# Altium footprint library Footprints.PcbLib: 158 footprints (part 5 of 10)
Each footprint in its own frame and in the unit in brackets; x right, y up, seen from the top. Pads: shape width x height; smd on the part's side, far side on the other; paste and mask are expansions set on the pad; w line width, h text height; cw(c..) or ccw(c..) is an arc to the next point about the centre after c.
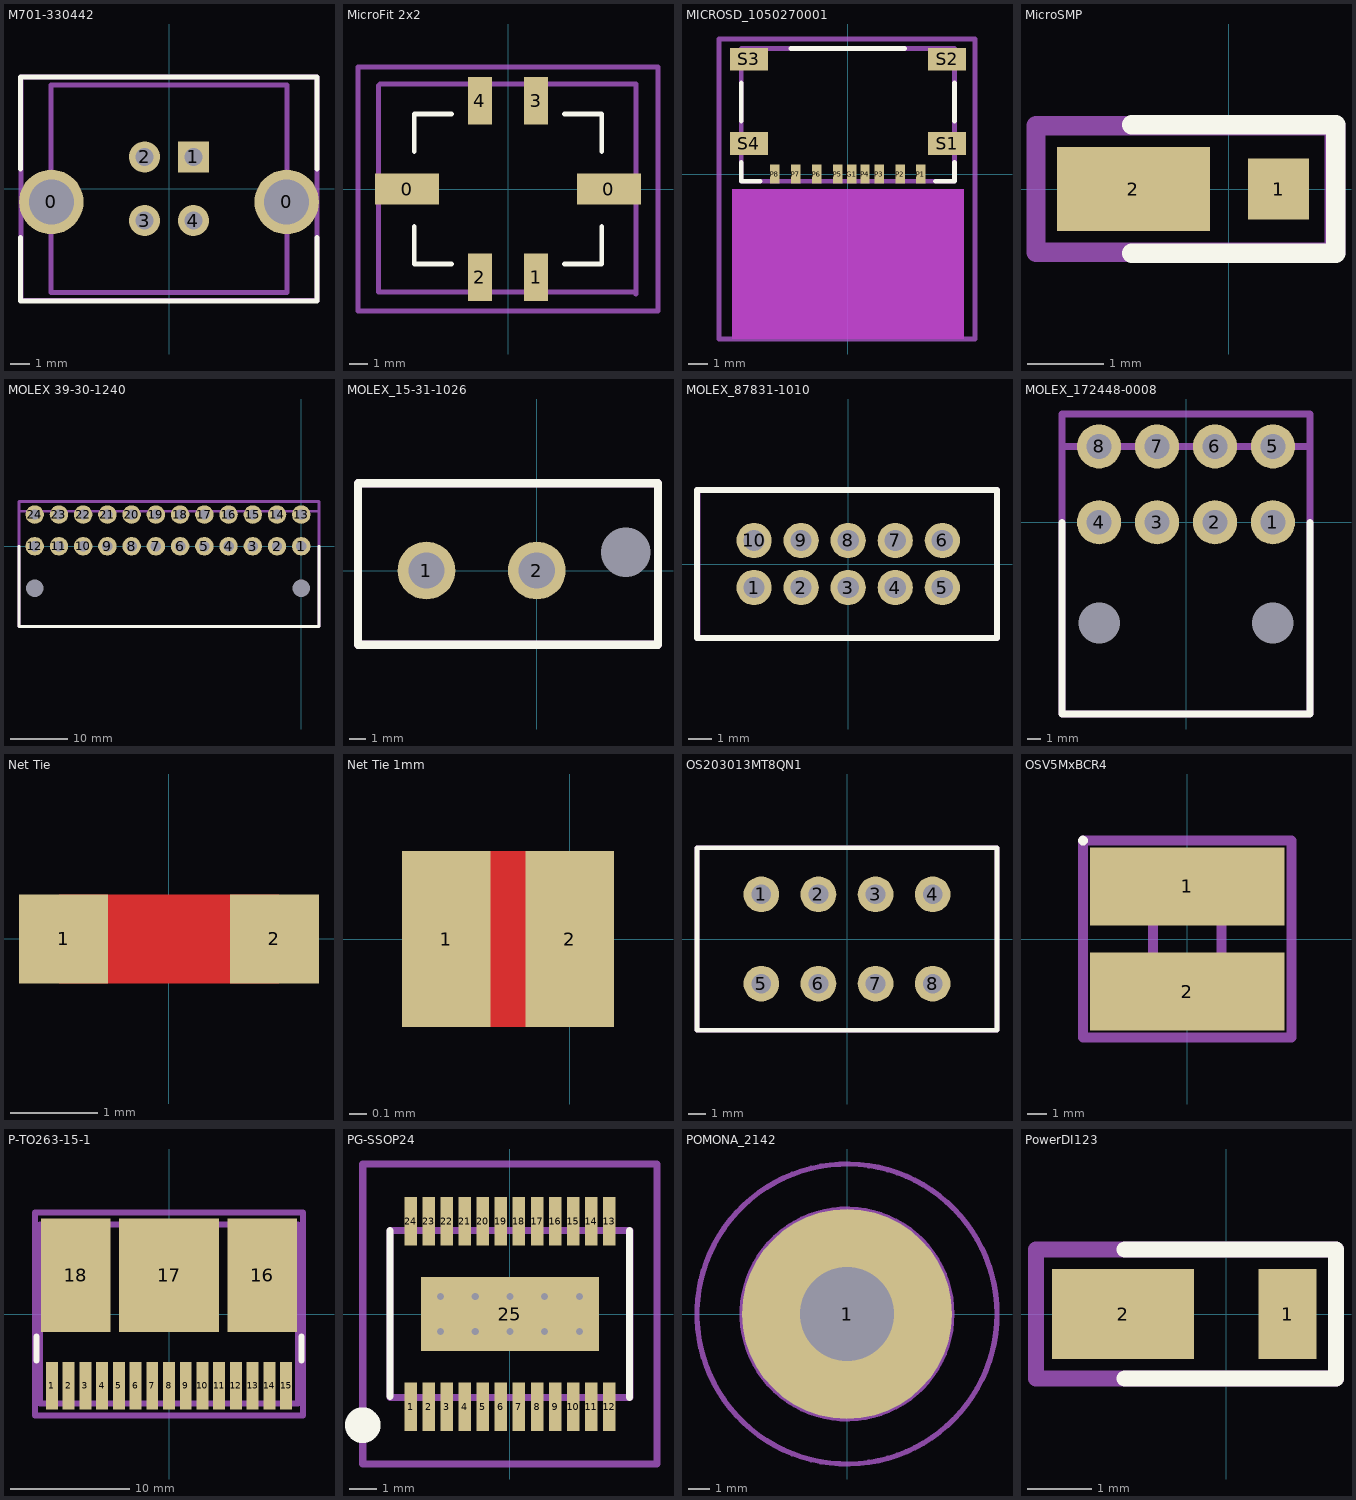
[diagram p4: the footprints below, top view; thin cyan lines are the x and y axes]

## M701-330442 [mm] "Vertical Boardmount USB Connector"
height 16.25
pads (6):
  round 3.3 hole 2.3 mask+0.102: 0(-6.02,-0.675) 0(6.02,-0.675)
  rect 1.6x1.6 hole 0.92 mask+0.102: 1(1.25,1.625)
  round 1.6 hole 0.92 mask+0.102: 2(-1.25,1.625) 3(-1.25,-1.625) 4(1.25,-1.625)
Top Overlay:
  lines w0.254: -7.6,-2.5 -7.6,-5.75 7.575,-5.75 7.575,-2.5 ; -7.6,1 -7.6,5.725 7.575,5.725 7.575,1
Mechanical 13:
  lines w0.254: -6.025,-5.3 6.025,-5.3 6.025,5.3 -6.025,5.3 -6.025,-5.3
Mechanical 15:
  lines w0.254: -7.575,-5.725 7.575,-5.725 7.575,5.725 -7.575,5.725 -7.575,-5.725
3D body: height 15.82, standoff -3.82, extent -7.575,-5.728 7.575,5.728

## MicroFit 2x2 [mm]
height 9.9
pads (6):
  rect 3.43x1.65 smd: 0(-5.385,0) 0(5.385,0)
  rect 1.27x2.54 smd: 1(1.5,-4.7) 2(-1.5,-4.7) 3(1.5,4.7) 4(-1.5,4.7)
Top Overlay:
  lines w0.254: -5,-2 -5,-4 -3,-4 ; -5,2 -5,4 -3,4 ; 3,-4 5,-4 5,-2 ; 3,4 5,4 5,2
Mechanical 13:
  lines w0.254: -6.9,-5.5 6.725,-5.5 6.825,-5.6 6.825,5.6 -6.825,5.6 -6.9,5.525 -6.9,-5.5
Mechanical 15:
  lines w0.254: -7.9,-6.5 -8,-6.5 ; -8,-6.5 8,-6.5 8,6.5 -8,6.5 -8,-6.5
3D body: height 9.95, standoff -0.01, extent -6.825,-5.6 6.825,5.6

## MICROSD_1050270001 [mm]
height 1.7
pads (13):
  rect 0.5x1 smd: G1(0.2,0) P1(3.85,0) P2(2.75,0) P3(1.65,0) P4(0.9,0) P5(-0.55,0) P6(-1.65,0) P7(-2.75,0) P8(-3.85,0)
  rect 2x1.2 smd: S1(5.225,1.61) S2(5.225,6.06) S3(-5.225,6.06) S4(-5.225,1.61)
Top Overlay:
  lines w0.254: -5.625,0.625 -5.625,-0.375 -4.625,-0.375 ; -5.625,2.8 -5.625,4.8 ; -3,6.625 3,6.625 ; 4.625,-0.375 5.625,-0.375 5.625,0.625 ; 5.625,2.8 5.625,4.8
Mechanical 13:
  lines w0.254: -5.625,-0.375 -5.625,6.625 5.625,6.625 5.625,-0.375 -5.625,-0.375
Mechanical 15:
  lines w0.254: -6.8,-8.7 6.7,-8.7 6.7,7.125 -6.8,7.125 -6.8,-8.7
Mechanical 15 keep-out:
  rectangle: -6.125,-8.7 6.125,-0.787
3D body: height 1.7, standoff 0, extent -5.62,-0.37 5.62,6.63

## MicroSMP [mm]
height 0.73
pads (2):
  rect 0.8x0.8 smd mask+0.102: 1(0.65,0)
  rect 2x1.1 smd mask+0.102: 2(-1.25,0)
Top Overlay:
  lines w0.254: -1.27,-0.838 1.397,-0.838 1.397,0.838 -1.27,0.838
Mechanical 13:
  lines w0.254: -2.525,-0.825 -2.525,0.825 1.375,0.825 1.375,-0.825 -2.525,-0.825
Mechanical 15:
  lines w0.254: -2.525,-0.825 1.4,-0.825 1.4,0.825 -2.525,0.825 -2.525,-0.825
3D body: height 1.35, standoff 0, extent -2.5,-1.101 1.35,1.052

## MOLEX 39-30-1240 [mm] "Connector for ATX power supply"
height 9.6
pads (26):
  round 0 hole 3 mask+0.102: 0(-46.2,-7.3) 0(0,-7.3)
  round 3.2 hole 1.8 mask+0.102: 1(0,0) 2(-4.2,0) 3(-8.4,0) 4(-12.6,0) 5(-16.8,0) 6(-21,0) 7(-25.2,0) 8(-29.4,0) 9(-33.6,0) 10(-37.8,0) 11(-42,0) 12(-46.2,0) 13(0,5.5) 14(-4.2,5.5) 15(-8.4,5.5) 16(-12.6,5.5) 17(-16.8,5.5) 18(-21,5.5) 19(-25.2,5.5) 20(-29.4,5.5) 21(-33.6,5.5) 22(-37.8,5.5) 23(-42,5.5) 24(-46.2,5.5)
Top Overlay:
  lines w0.508: -48.92,0 -48.92,-13.868 3.073,-13.868 3.073,0
Mechanical 13:
  lines w0.508: -48.895,-13.868 3.073,-13.868 3.073,6.071 -48.895,6.071 -48.895,-13.843
Mechanical 15:
  lines w0.508: -48.92,-13.868 -48.92,7.722 3.073,7.722 3.073,-13.868 -48.92,-13.868
3D body: height 11.4, standoff -3.6, extent -48.901,-13.854 3.099,6.081

## MOLEX_15-31-1026 [mm]
height 15
pads (3):
  round 0 hole 3 mask+0.102: 0(5.4,1.1)
  round 3.5 hole 2.2 mask+0.102: 1(-6.7,0) 2(0,0)
Top Overlay:
  lines w0.508: -10.85,-4.5 -10.85,5.3 7.35,5.3 7.35,-4.5 -10.85,-4.5
Mechanical 1:
  lines w0.508: 7.35,5.3 7.35,5.3 ; 7.35,5.3 7.35,5.3 ; 7.35,-4.5 7.35,-4.5
Mechanical 13:
  lines w0.508: -10.85,-4.5 -10.85,5.3 7.35,5.3 7.35,-4.5 -10.85,-4.5
Mechanical 15:
  lines w0.508: -10.85,-4.5 7.35,-4.5 7.35,5.3 -10.85,5.3 -10.85,-4.5
3D body: height 15, standoff -3.8, extent -10.85,-4.5 7.35,5.3

## MOLEX_87831-1010 [mm] "Boardmount Receptacle for 2x5 IDC Header"
height 6.4
pads (10):
  round 1.5 hole 0.9: 1(-4,-1) 2(-2,-1) 3(0,-1) 4(2,-1) 5(4,-1) 6(4,1) 7(2,1) 8(0,1) 9(-2,1) 10(-4,1)
Top Overlay:
  lines w0.254: -6.426,-3.15 6.325,-3.15 6.325,3.15 -6.426,3.15 -6.426,-3.15
Mechanical 13:
  lines w0.254: -6.401,-3.15 6.325,-3.15 6.325,3.15 -6.401,3.15 -6.401,-3.15
3D body: height 6.5, standoff -3.4, extent -6.35,-3.175 6.3,3.125

## MOLEX_172448-0008 [mm]
height 9.6
pads (10):
  round 0 hole 3 mask+0.102: 0(-6.3,-7.3) 0(6.3,-7.3)
  round 3.2 hole 1.8 mask+0.102: 1(6.3,0) 2(2.1,0) 3(-2.1,0) 4(-6.3,0) 5(6.3,5.5) 6(2.1,5.5) 7(-2.1,5.5) 8(-6.3,5.5)
Top Overlay:
  lines w0.508: -9,0 -9,-13.9 9,-13.9 9,0
Mechanical 13:
  lines w0.508: -9,-13.9 9,-13.9 9,5.5 -9,5.5 -9,0 -9,-13.9
Mechanical 15:
  lines w0.508: -9,-13.9 9,-13.9 9,7.85 -9,7.85 -9,-13.9
3D body: height 9.6, standoff 0, extent -9,-13.9 9,0

## Net Tie [mm]
pads (2):
  rect 1.02x1.02 smd mask+0.102: 1(-1.205,0) 2(1.205,0)
Top Layer:
  lines w1.02: -1.205,0 1.205,0
Top Solder:
  rectangle: -0.65,-0.6 0.7,0.6
3D body: height 1.99, standoff -0.01, extent -1.451,-0.5 1.451,0.5

## Net Tie 1mm [mm]
pads (2):
  rect 0.5x1 smd: 1(-0.7,0) 2(0,0)
Top Layer:
  lines w0.5: -0.7,0.25 0,0.25 ; -0.675,-0.25 0,-0.25

## OS203013MT8QN1 [mm] "DP3T Slide Switch"
height 2.88
pads (8):
  round 2 hole 1.1 mask+0.102: 1(-4.8,2.5) 2(-1.6,2.5) 3(1.6,2.5) 4(4.8,2.5) 5(-4.8,-2.5) 6(-1.6,-2.5) 7(1.6,-2.5) 8(4.8,-2.5)
Top Overlay:
  lines w0.254: -8.4,-5.1 8.4,-5.1 8.4,5.1 -8.4,5.1 -8.4,-5.1
Mechanical 13:
  lines w0.254: -8.4,-5.1 8.4,-5.1 8.4,5.1 -8.4,5.1 -8.4,-5.1
Mechanical 15:
  lines w0.254: -8.4,-5.1 8.4,-5.1 8.4,5.1 -8.4,5.1 -8.4,-5.1
3D body: height 10, standoff 0, extent -5.1,-1.8 -2,1.8
3D body: height 7, standoff 0, extent -8.4,-5.1 8.4,5.1
3D body: height 7.1, standoff 1, extent -5.1,-1.8 5.1,1.8

## OSV5MxBCR4 [mm] "High Power Red LED"
height 1.2
pads (2):
  rect 10x4 smd mask+0.102: 1(0,2.7) 2(0,-2.7)
Top Overlay:
  circle w0.254: c-5.35,5.05 r0.125
Mechanical 13:
  lines w0.508: -1.75,-1.75 -1.75,1.75 1.75,1.75 1.75,-1.75 -1.75,-1.75
Mechanical 15:
  lines w0.508: -5.35,-5.05 -5.35,5.05 5.35,5.05 5.35,-5.05 -5.35,-5.05
3D body: height 1.6, standoff -0.05, extent -1.4,-1.775 1.4,1.725

## P-TO263-15-1 [mm]
height 4.4
pads (18):
  rect 1x4 smd mask+0.102: 1(-9.8,-6) 2(-8.4,-6) 3(-7,-6) 4(-5.6,-6) 5(-4.2,-6) 6(-2.8,-6) 7(-1.4,-6) 8(0,-6) 9(1.4,-6) 10(2.8,-6) 11(4.2,-6) 12(5.6,-6) 13(7,-6) 14(8.4,-6) 15(9.8,-6)
  rect 5.8x9.5 smd mask+0.102: 16(7.8,3.25) 18(-7.8,3.25)
  rect 8.4x9.5 smd mask+0.102: 17(0,3.25)
Top Overlay:
  lines w0.508: -11.1,-3.9 -11.1,-1.9 ; 11.1,-3.9 11.1,-1.9
Mechanical 13:
  lines w0.508: -10.8,-7.5 -10.8,7.5 10.8,7.5 10.8,-7.5 -10.6,-7.5 -10.8,-7.5
Mechanical 15:
  lines w0.508: -11.2,-8.5 11.2,-8.5 11.2,8.5 -11.2,8.5 -11.2,-8.5
3D body: height 4.45, standoff 0, extent -10.8,-7.4 10.8,7.6

## PG-SSOP24 [mm]
height 1.7
pads (25):
  rect 0.45x1.75 smd: 1(-3.575,-3.345) 2(-2.925,-3.345) 3(-2.275,-3.345) 4(-1.625,-3.345) 5(-0.975,-3.345) 6(-0.325,-3.345) 7(0.325,-3.345) 8(0.975,-3.345) 9(1.625,-3.345) 10(2.275,-3.345) 11(2.925,-3.345) 12(3.575,-3.345) 13(3.575,3.345) 14(2.925,3.345) 15(2.275,3.345) 16(1.625,3.345) 17(0.975,3.345) 18(0.325,3.345) 19(-0.325,3.345) 20(-0.975,3.345) 21(-1.625,3.345) 22(-2.275,3.345) 23(-2.925,3.345) 24(-3.575,3.345)
  rect 6.4x2.65 smd: 25(0,0)
via -2.5,-0.625 diameter 0.635 hole 0.254
via -1.25,-0.625 diameter 0.635 hole 0.254
via 0,-0.625 diameter 0.635 hole 0.254
via 1.25,-0.625 diameter 0.635 hole 0.254
via 2.5,-0.625 diameter 0.635 hole 0.254
via 2.5,0.625 diameter 0.635 hole 0.254
via 1.25,0.625 diameter 0.635 hole 0.254
via 0,0.625 diameter 0.635 hole 0.254
via -1.25,0.625 diameter 0.635 hole 0.254
via -2.5,0.625 diameter 0.635 hole 0.254
Bottom Layer:
  region: -3.2,1.325 3.2,1.325 3.2,-1.325 -3.2,-1.325
Top Overlay:
  circle w1: c-5.3,-4 r0.141
  lines w0.254: -4.325,-2.975 -4.325,3 ; 4.3,-3 4.3,3
Bottom Solder:
  region: -3.3,1.425 3.3,1.425 3.3,-1.425 -3.3,-1.425
Mechanical 13:
  lines w0.254: -4.325,-3 -4.325,3 4.325,3 4.325,-3 -4.325,-3
Mechanical 15:
  lines w0.254: -5.3,-5.4 5.3,-5.4 5.3,5.4 -5.3,5.4 -5.3,-5.4
3D body: height 1.21, standoff -0.01, extent -3.9,-3.201 3.899,3.201

## POMONA_2142 [mm] "Single"
height 22.35
pads (1):
  round 10 hole 4.5 mask+0.102: 1(0,0)
Mechanical 13:
  circle w0.254: c0,0 r5
Mechanical 15:
  circle w0.254: c0,0 r7.15
3D body: height 21, standoff -9.5, extent -7.25,-7.25 7.25,7.25

## PowerDI123 [mm]
height 1
pads (2):
  rect 0.9x1.4 smd mask+0.102: 1(0.95,0)
  rect 2.2x1.4 smd mask+0.102: 2(-1.6,0)
Top Overlay:
  lines w0.254: -1.575,-1 1.7,-1 1.7,1 -1.575,1
Mechanical 13:
  lines w0.254: 1.675,1 -2.95,1 -2.95,-1 1.7,-1 1.7,1
Mechanical 15:
  lines w0.254: -2.95,-1 -2.95,1 1.7,1 1.7,-1 -2.95,-1
3D body: height 1, standoff 0, extent -2.025,-0.875 0.725,0.875
3D body: height 1.1, standoff 0.1, extent 0.2,-0.85 0.4,0.85
3D body: height 0.2, standoff 0.1, extent 0.725,-0.65 1.15,0.65
3D body: height 0.2, standoff 0.1, extent -2.425,-0.65 -2.025,0.65